# Altium footprint library Connectors.PCBLIB: 109 footprints (part 7 of 7)
Each footprint in its own frame and in the unit in brackets; x right, y up, seen from the top. Pads: shape width x height; smd on the part's side, far side on the other; paste and mask are expansions set on the pad; w line width, h text height; cw(c..) or ccw(c..) is an arc to the next point about the centre after c.
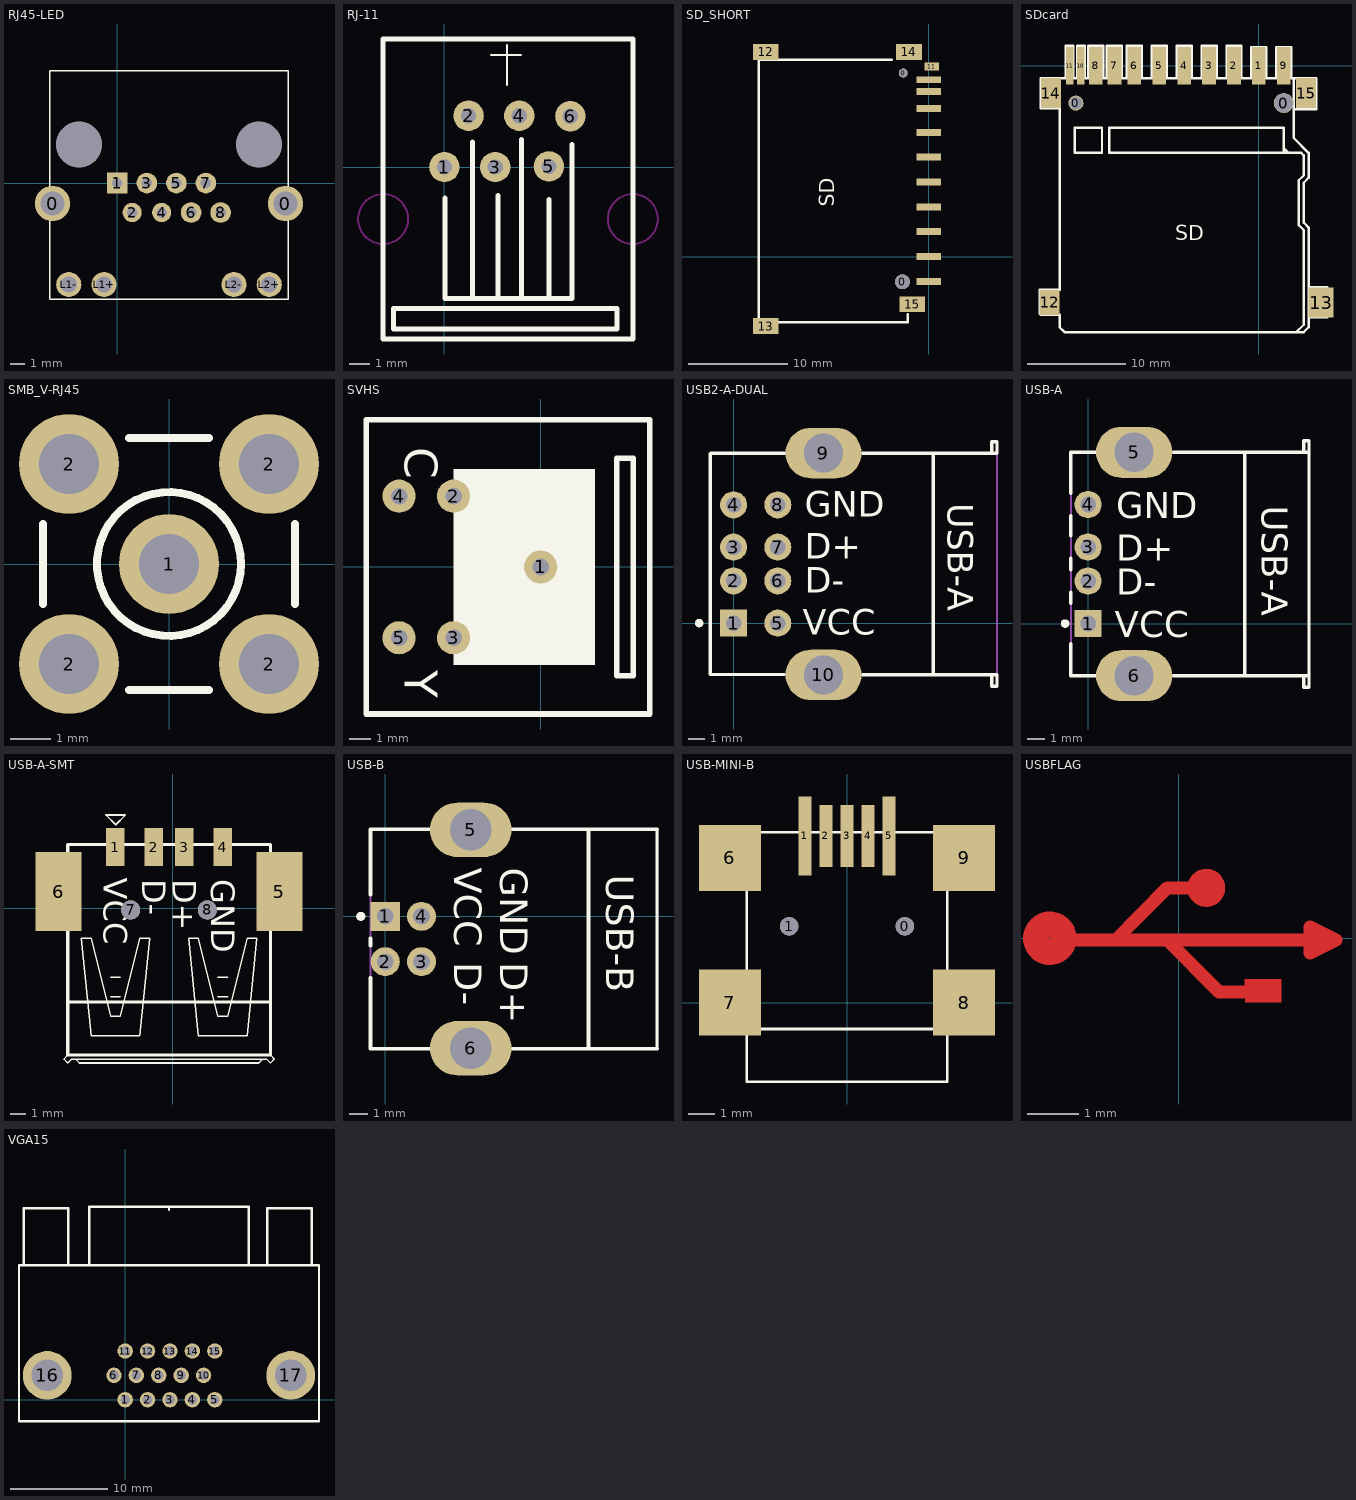
[diagram p6: the footprints below, top view; thin cyan lines are the x and y axes]

## RJ45-LED [mm]
pads (16):
  round 2.4 hole 1.6: 0(-4.4,-1.39) 0(11.4,-1.39)
  rect 1.4x1.4 hole 0.7: 1(0,0)
  round 1.3 hole 0.7: 2(1,-2) 4(3,-2)
  round 1.4 hole 0.7: 3(2,0) 5(4,0) 6(5,-2) 7(6,0) 8(7,-2)
  round 1.7 hole 1.1: L1+(-0.9,-6.89) L1-(-3.3,-6.89) L2+(10.3,-6.89) L2-(7.9,-6.89)
  round 3.1 hole 3.1: ""(-2.6,2.61) ""(9.6,2.61)
Top Overlay:
  lines w0.1: -4.6,-7.89 -4.6,7.61 11.6,7.61 11.6,-7.89 -4.6,-7.89

## RJ-11 [mil]
height 590.55
pads (6):
  round 60 hole 30: 1(0,0) 2(47.48,101.1) 3(100,0) 4(147.48,101.1) 5(205.67,1.1) 6(247.87,100)
Top Overlay:
  lines w3.94: 91.49,220.45 150.55,220.45 ; 122.99,161.39 122.99,220.45 ; 122.99,216.51 122.99,240.14
  lines w10: 1.42,-61.1 1.42,-258.58 251.42,-258.58 251.42,43.86 ; 55.35,-258.58 55.35,48.9 ; 105.35,-258.58 105.35,-56.06 ; 151.42,-258.58 151.42,54.25 ; 206.14,-258.58 206.14,-64.25 ; 367.08,-338.58 -120.63,-338.58 -120.63,251.97 371.5,251.97 ; 371.18,-338.58 371.18,251.97 ; -100.63,-318.58 -100.63,-278.58 339.37,-278.58 339.37,-318.58 -100.63,-318.58
Keep-Out Layer:
  circle w3.94: c370.86,-102.52 r49.21
  circle w3.94: c-120.63,-102.52 r49.21

## SD_SHORT [mm]
height 3
pads (17):
  round 1.5 hole 1.5: 0(-2.656,-2.54)
  round 0.9 hole 0.9 unplated: 0(-2.566,18.475)
  rect 2.5x0.7 smd: 1(0,0) 2(0,2.5) 3(0,5) 4(0,7.5) 5(0,10) 6(0,12.5) 7(0,14.925) 8(0,16.625) 9(0,-2.5) 10(0,17.8)
  rect 1.5x0.8 smd: 11(0.3,19.13)
  rect 2.6x1.6 smd: 12(-16.404,20.6) 13(-16.404,-7) 14(-1.988,20.6) 15(-1.664,-4.8)
Top Overlay:
  lines w0.254: -3.7,19.8 -17.1,19.8 -17.1,-6.6 -2.1,-6.6 -2.1,-5.8
  text "SD" at -9.5,5 h1.52

## SDcard [mil] "WWW.OURAVR.COM"
pads (17):
  round 60 hole 52: 0(-735,-150)
  round 80 hole 75: 0(100,-150)
  rect 55x150 smd: 1(0,0) 2(-100,0) 3(-200,0) 4(-300,0) 5(-400,0) 6(-500,0) 7(-580,0) 8(-655,0) 9(100,0)
  rect 30x150 smd: 10(-715,0) 11(-760,0)
  rect 80x100 smd: 12(-840,-950)
  rect 100x120 smd: 13(249.63,-950.84)
  rect 80x120 smd: 14(-835,-110) 15(190,-110)
Top Overlay:
  lines w10: -775,-50 -775,80 -745,80 -745,-50 -800,-50 -875,-50 -875,-170 -800,-170 -800,-900 -880,-900 -880,-995 -875,-1000 -800,-1000 -800,-1050 -780,-1070 -770,-1070 180,-1070 200,-1050 200,-650 180,-630 180,-470 200,-450 200,-440 200,-370 200,-350 140,-290 140,-60 140,-50 ; -750,-50 140,-50 ; -730,-50 -730,80 -700,80 -700,-50 ; -685,-45 -685,80 -625,80 -625,-45 ; -650,-350 -630,-350 -630,-250 -740,-250 -740,-350 -640,-350 ; -610,-45 -610,80 -550,80 -550,-45 ; -530,-45 -530,80 -470,80 -470,-45 ; -430,-45 -430,80 -370,80 -370,-45 ; -330,-45 -330,80 -270,80 -270,-45 ; -230,-45 -230,80 -170,80 -170,-45 ; -130,-45 -130,80 -70,80 -70,-45 ; -30,-50 -30,75 30,75 30,-50 ; 70,-50 70,75 130,75 130,-50 ; 100,-330 120,-350 ; 140,-175 230,-175 230,-50 140,-50 ; 150,-1070 180,-1040 180,-670 180,-660 160,-640 160,-460 180,-440 180,-360 170,-350 100,-350 ; 200,-1010 275,-1010 ; 200,-890 275,-890 ; 100,-350 100,-340 100,-250 -600,-250 -600,-350 100,-350
  text "SD" at -335,-700 h60

## SMB_V-RJ45 [mm] "Connector; SMB Straight"
pads (5):
  round 2.5 hole 1.5: 1(0,0) 2(-2.5,-2.5) 2(-2.5,2.5) 2(2.5,-2.5) 2(2.5,2.5)
Top Overlay:
  circle w0.2: c0,0 r1.8
  lines w0.2: -3.15,-1 -3.15,1 ; -1,-3.15 1,-3.15 ; -1,3.15 1,3.15 ; 3.15,-1 3.15,1
Mechanical 1:
  circle w0.025: c0,0 r1.8
  circle w0.025: c0,0 r1.05
  circle w0.025: c0,0 r0.2

## SVHS [mil] "S VIDEO PORT"
pads (5):
  round 60 hole 30: 1(0,0) 2(-157.48,127.95) 3(-157.48,-127.95) 4(-255.91,127.95) 5(-255.91,-127.95)
Top Overlay:
  rectangle: -157.48,-177.17 98.43,177.17
  lines w10: -314.96,-265.75 196.85,-265.75 196.85,265.75 -314.96,265.75 -314.96,-265.75 ; 137.8,-196.85 137.8,196.85 167.32,196.85 167.32,-196.85 137.8,-196.85
  text "C" at -246.06,216.54 h60
  text "Y" at -246.06,-187.01 h60
3D body "SVHS.STEP": height 767.72, standoff -59.06, extent -314.96,-255.9 118.11,255.91

## USB2-A-DUAL [mm] "Connector; USB1.1, Type A, Thru-Hole; 4x4 Position; Right Angle"
height 15.82
pads (10):
  rect 1.6x1.6 hole 0.92: 1(0,0)
  round 1.6 hole 0.92: 2(0,2.5) 3(0,4.5) 4(0,7) 5(2.62,0) 6(2.62,2.5) 7(2.62,4.5) 8(2.62,7)
  oval 4.5x3 hole 2.3: 9(5.33,10.07) 10(5.33,-3.07)
Top Overlay:
  circle w0.25: c-2.04,0 r0.125
  lines w0.2: 3.008,-3.048 1.908,-3.048 -1.397,-3.048 -1.39,-3.041 -1.39,-1.01 -1.39,8.01 -1.39,10.04 -1.36,10.07 1.95,10.07 3.03,10.07 ; 7.64,-3.07 15.61,-3.07 15.61,-3.75 15.29,-3.75 15.29,-3.07 ; 7.64,10.07 15.61,10.07 15.61,10.75 15.29,10.75 15.29,10.07
  lines w0.203: 11.83,-3.07 11.83,10.03
  text "VCC" at 4.11,-0.689 h1.52
  text "D-" at 4.21,1.811 h1.52
  text "D+" at 4.21,3.811 h1.52
  text "GND" at 4.21,6.311 h1.52
  text "USB-A" at 12.7,7.112 h1.52
Mechanical 1:
  lines w0.1: 15.61,-3.07 15.61,10.07
  text "PCB Edge" at 15.242,-2.65 h0.2
Mechanical 13:
  lines w0.1: -1.39,-3.07 15.29,-3.07 15.29,-3.75 15.61,-3.75 15.61,10.75 15.29,10.75 15.29,10.07 -1.39,10.07
3D body: height 15.82, standoff 0, extent -1.389,-3.749 15.609,10.749

## USB-A [mm] "Connector; USB1.1, Type A, Thru-Hole; 4 Position; Right Angle"
height 7.01
pads (6):
  rect 1.6x1.6 hole 0.92: 1(0,0)
  round 1.6 hole 0.92: 2(0,2.5) 3(0,4.5) 4(0,7)
  oval 4.5x3 hole 2.3: 5(2.71,10.07) 6(2.71,-3.07)
Top Overlay:
  circle w0.25: c-1.35,0 r0.125
  lines w0.2: -1.01,-1.2 -1.01,-3.065 0.41,-3.065 ; -1.01,1.2 -1.01,1.84 ; -1.01,3.16 -1.01,3.84 ; -1.01,5.16 -1.01,6.34 ; -1.01,7.66 -1.01,10.065 0.41,10.065 ; 5.01,-3.065 12.99,-3.065 ; 5.01,10.065 12.99,10.065 ; 12.67,-3.065 12.67,-3.75 12.99,-3.75 12.99,-3.065 ; 12.67,10.065 12.67,10.75 12.99,10.75 12.99,10.065 ; 12.99,-3.065 12.99,10.065
  lines w0.203: 9.21,-3.065 9.21,10.065
  text "GND" at 1.67,6.184 h1.52
  text "D+" at 1.67,3.684 h1.52
  text "D-" at 1.67,1.684 h1.52
  text "VCC" at 1.57,-0.816 h1.52
  text "USB-A" at 10.21,6.93 h1.52
Mechanical 13:
  lines w0.1: -1.01,-3.065 -1.01,10.065 12.67,10.065 12.67,10.75 12.99,10.75 12.99,-3.75 12.67,-3.75 12.67,-3.065 -1.01,-3.065
3D body: height 7.01, standoff 0, extent -1.009,-3.749 12.989,10.749

## USB-A-SMT [mm]
pads (8):
  rect 1.2x2.5 smd: 1(-3.754,3.973) 2(-1.254,3.973) 3(0.746,3.973) 4(3.246,3.973)
  rect 3x5.15 smd: 5(6.946,1.073) 6(-7.454,1.073)
  round 1.25 hole 1.25 unplated: 7(-2.754,-0.127) 8(2.246,-0.127)
Top Overlay:
  lines w0.1: -6.851,-9.586 -7.105,-9.84 -6.851,-10.094 -6.597,-9.84 -6.343,-9.84 ; -4.057,-5.776 -3.422,-5.776 ; -4.057,-4.506 -3.422,-4.506 ; 2.928,-5.776 3.563,-5.776 ; 2.928,-4.506 3.563,-4.506 ; 6.357,-9.586 6.611,-9.84 6.357,-10.094 6.103,-9.84 5.849,-9.84 ; -6.343,-9.84 -6.089,-10.1 5.595,-10.1 5.849,-9.84 ; -6.343,-9.84 5.849,-9.84 ; -5.962,-1.966 -5.327,-8.316 -2.152,-8.316 -1.517,-1.966 -2.152,-1.966 -3.422,-7.046 -4.057,-7.046 -5.327,-1.966 -5.962,-1.966 ; -4.367,6.063 -3.732,5.428 -3.097,6.063 -4.367,6.063 ; 1.023,-1.966 1.658,-8.316 4.833,-8.316 5.468,-1.966 4.833,-1.966 3.563,-7.046 2.928,-7.046 1.658,-1.966 1.023,-1.966
  lines w0.203: -6.851,-6.127 6.357,-6.127 ; -6.851,-9.586 6.357,-9.586 6.357,4.13 -6.851,4.13 -6.851,-9.586
  text "GND" at 2.501,1.886 h1.52
  text "D+" at 0.001,1.886 h1.52
  text "D-" at -1.999,1.886 h1.52
  text "VCC" at -4.499,1.986 h1.52
3D body: height 6.69, standoff 0, extent -6.851,-9.585 6.356,4.13

## USB-B [mm] "Connector; USB1.1, Type B, Thru-Hole; 4 Position; Right Angle"
height 10.95
pads (6):
  rect 1.6x1.6 hole 0.92: 1(0,0)
  round 1.6 hole 0.92: 2(0,-2.5) 3(2,-2.5) 4(2,0)
  oval 4.5x3 hole 2.3: 5(4.71,4.77) 6(4.71,-7.27)
Top Overlay:
  circle w0.25: c-1.35,0 r0.125
  lines w0.154: 14.99,-7.3 14.99,4.8
  lines w0.2: -0.81,-3.39 -0.81,-7.3 2.41,-7.3 ; -0.81,-1.61 -0.81,-1.2 ; -0.81,1.2 -0.81,4.8 2.41,4.8 ; 7.01,-7.3 14.99,-7.3 ; 7.01,4.8 14.99,4.8
  lines w0.203: 11.21,-7.3 11.21,4.8
  text "USB-B" at 12.192,2.286 h1.52
  text "GND" at 6.35,2.667 h1.52
  text "D+" at 6.35,-2.54 h1.52
  text "D-" at 3.81,-2.54 h1.52
  text "VCC" at 3.81,2.667 h1.52
Mechanical 1:
  lines w0.1: 15.01,-7.3 15.01,4.8
Mechanical 13:
  lines w0.1: -0.81,-7.3 -0.81,4.8 14.99,4.8 14.99,-7.3 -0.81,-7.3
3D body: height 10.95, standoff 0, extent -0.81,-7.3 14.99,4.8
3D body: height 4, standoff -2, extent -0.395,-0.399 0.398,0.394
3D body: height 4, standoff -2, extent 1.605,-0.399 2.398,0.394
3D body: height 4, standoff -2, extent 1.605,-2.874 2.398,-2.081
3D body: height 4, standoff -2, extent -0.42,-2.899 0.373,-2.106

## USB-MINI-B [mm]
pads (11):
  round 0.7 hole 0.7: 0(2.2,2.9) 1(-2.2,2.9)
  rect 0.5x3 smd: 1(-1.6,6.335) 5(1.6,6.335)
  rect 0.5x2.35 smd: 2(-0.8,6.335) 3(0,6.335) 4(0.8,6.335)
  rect 2.35x2.5 smd: 6(-4.45,5.5) 7(-4.45,0) 8(4.45,0) 9(4.45,5.5)
Top Overlay:
  lines w0.1: -3.81,-1 3.81,-1 ; -3.81,-3 3.81,-3 3.81,6.477 -3.81,6.477 -3.81,-0.635 -3.81,-3
3D body: height 6.69, standoff 0, extent -3.86,-3.05 3.86,6.527

## USBFLAG [mm]
Top Layer:
  circle w0.5: c-2.5,0 r0.268
  circle w0.25: c0.536,0.979 r0.244
  rectangle: 1.29,-1.25 2,-0.792
  region: 1.29,-0.792 1.829,-0.792 1.829,-1.068 1.29,-1.068
  region: 
  region: 
  lines w0: 1.29,-1.068 1.29,-0.792 1.829,-0.792 1.829,-1.068 1.29,-1.068
  lines w0.252: -2.234,-0.033 2.802,-0.033 ; -1.227,-0.033 -0.22,0.979 0.536,0.979 ; -0.22,-0.033 0.788,-1.045 1.291,-1.045 ; 2.55,-0.286 3.054,-0.033 2.55,0.22
  lines w0.254: 2.55,-0.286 2.55,0.22

## VGA15 [mm]
pads (17):
  round 1.58 hole 1: 1(0,0) 2(2.3,0) 3(4.6,0) 4(6.9,0) 5(9.2,0) 6(-1.15,2.5) 7(1.15,2.5) 8(3.45,2.5) 9(5.75,2.5) 10(8.05,2.5) 11(0,5) 12(2.3,5) 13(4.6,5) 14(6.9,5) 15(9.2,5)
  round 5 hole 3.25: 16(-8,2.5) 17(17,2.5)
Top Overlay:
  lines w0.254: -10.9,-2.2 -10.9,13.8 19.9,13.8 19.9,-2.2 -10.89,-2.2 -10.9,-2.19 ; -10.4,13.8 -10.4,19.67 -5.83,19.67 -5.83,13.82 ; -3.7,13.8 -3.7,19.8 12.7,19.8 12.7,13.8 ; 4.5,19.5 4.5,19.8 ; 14.6,13.8 14.6,19.68 19.18,19.68 19.18,13.84
3D body "SW3dPS-Connector, D-Sub, 15 pin HD, RA, Receptacle.STEP": height 12.77, standoff -3.27, extent -11.055,-0.875 19.755,20.225